# Altium footprint library PBL - THD Packages.PcbLib: 256 footprints (part 4 of 16)
Each footprint in its own frame and in the unit in brackets; x right, y up, seen from the top. Pads: shape width x height; smd on the part's side, far side on the other; paste and mask are expansions set on the pad; w line width, h text height; cw(c..) or ccw(c..) is an arc to the next point about the centre after c.
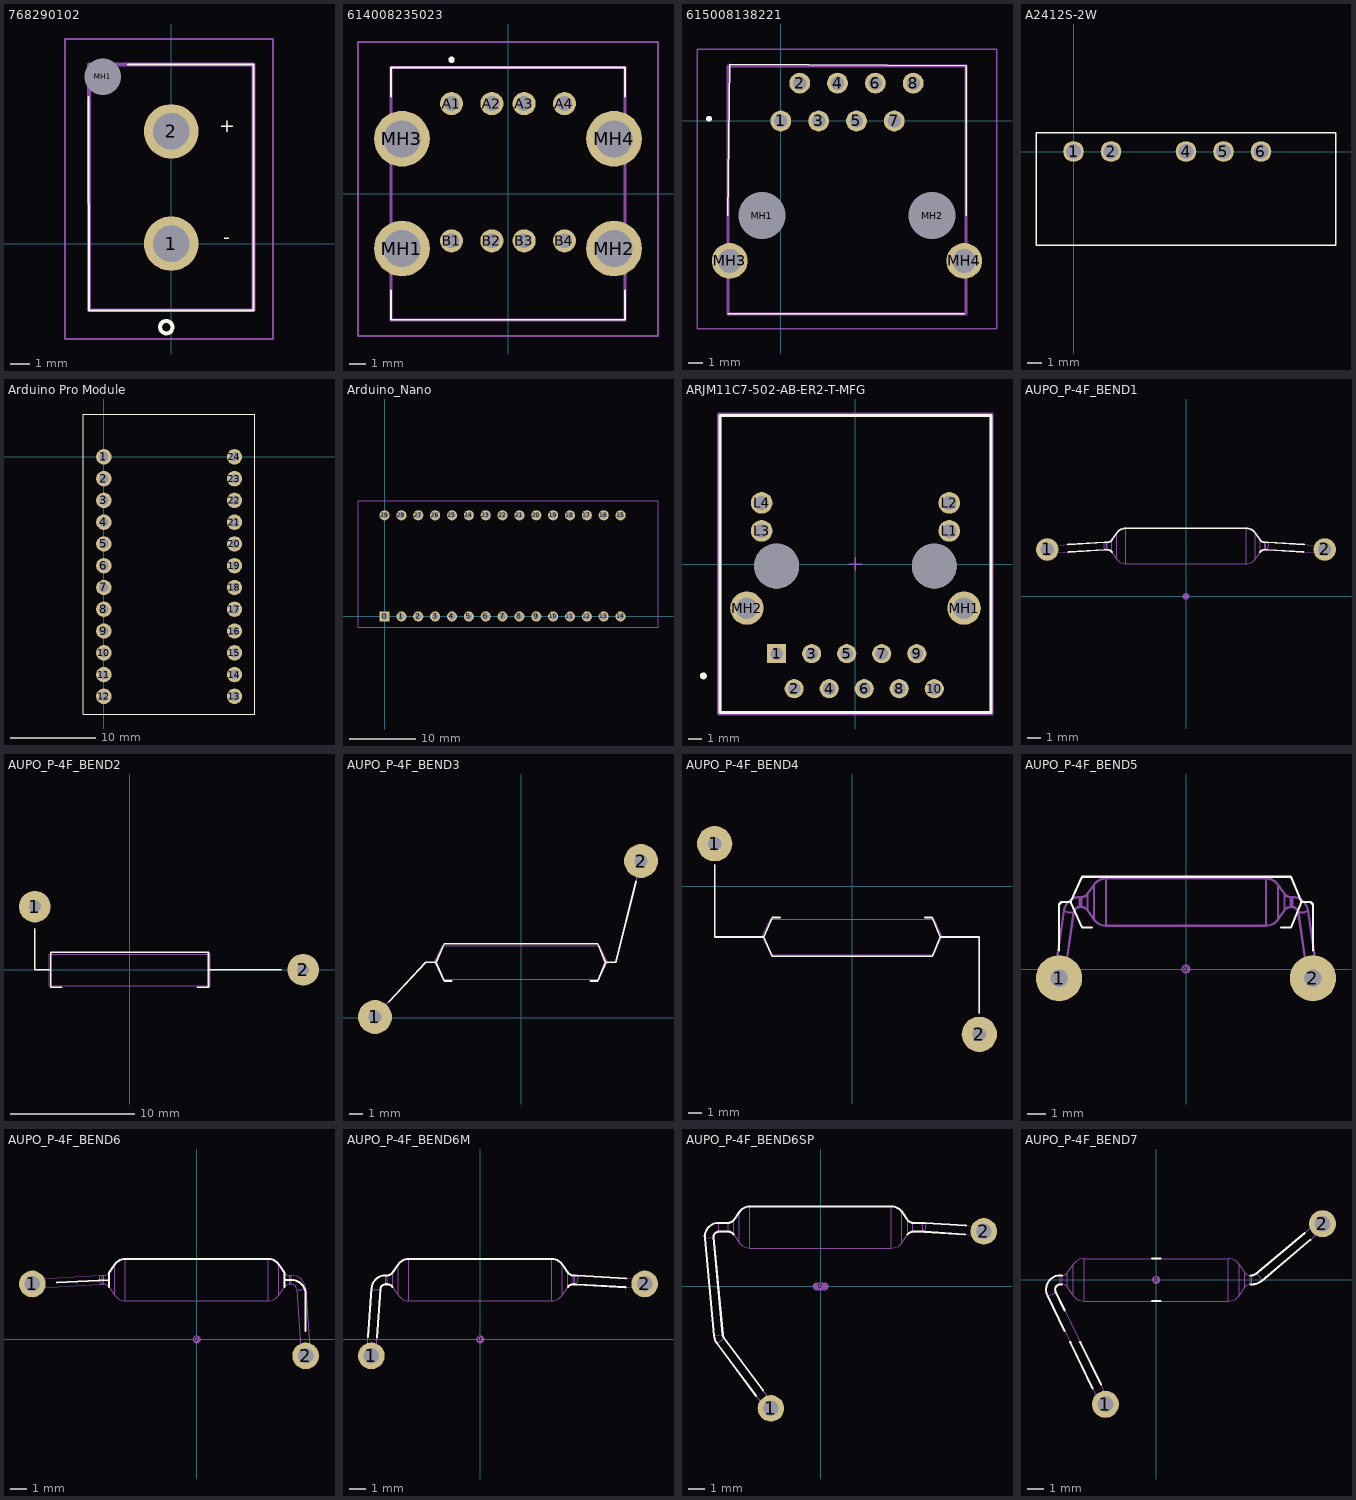
[diagram p3: the footprints below, top view; thin cyan lines are the x and y axes]

## 768290102 [mm] "Molex mega fit"
pads (3):
  round 2.775 hole 1.85: 1(0,0) 2(0,5.7)
  round 0.925 hole 1.85 unplated: MH1(-3.48,8.47)
Top Overlay:
  circle w0.2: c-0.25,-4.25 r0.316
  lines w0.1: -4.2,7.45 -4.175,-3.39 4.175,-3.39 4.175,9.09 -2.2,9.09
  text "+" at 2.45,5.426 h1.2
  text "-" at 2.65,-0.231 h1.2
13 - 3D Top Side:
  lines w0.2: -4.175,-3.39 -4.175,9.09 4.175,9.09 4.175,-3.39 -4.175,-3.39
15 - Top Courtyards:
  lines w0.1: -5.405,-4.85 -5.405,10.395 5.175,10.395 5.175,-4.85 -5.405,-4.85
3D body "76829-0102.stp": height 15.15, standoff -5, extent -4.298,-3.39 4.175,9.293

## 614008235023 [mm]
pads (12):
  round 1.431 hole 0.92: A1(-3.5,5.58) A2(-1,5.58) A3(1,5.58) A4(3.5,5.58) B1(-3.5,-2.92) B2(-1,-2.92) B3(1,-2.92) B4(3.5,-2.92)
  round 3.45 hole 2.3: MH1(-6.57,-3.4) MH2(6.57,-3.4) MH3(-6.57,3.4) MH4(6.57,3.4)
Top Overlay:
  lines w0.1: -7.25,-6 -7.25,-7.82 7.25,-7.82 7.25,-6 ; -7.25,6 -7.25,7.82 7.25,7.82 7.25,6
  lines w0.2: -3.6,8.3 cw(c-3.5,8.3) -3.4,8.3 cw(c-3.5,8.3) -3.6,8.3
13 - 3D Top Side:
  lines w0.2: -7.25,-7.82 7.25,-7.82 7.25,7.82 -7.25,7.82 -7.25,-7.82
15 - Top Courtyards:
  lines w0.1: -9.295,-8.82 9.295,-8.82 9.295,9.4 -9.295,9.4 -9.295,-8.82
3D body "614008235023.stp": height 16.95, standoff -3.55, extent -7.8,-7.925 7.8,7.725

## 615008138221 [mm] "RJ45 Shielded Straight"
pads (12):
  round 1.4 hole 0.9: 1(0,0) 2(1.27,2.54) 3(2.54,0) 4(3.81,2.54) 5(5.08,0) 6(6.35,2.54) 7(7.62,0) 8(8.89,2.54)
  round 1.585 hole 3.17 unplated: MH1(-1.27,-6.35) MH2(10.16,-6.35)
  round 2.4 hole 1.6: MH3(-3.43,-9.4) MH4(12.32,-9.4)
Top Overlay:
  lines w0.1: -3.555,-12.95 12.32,-12.95 ; -3.555,-6.35 -3.43,3.81 12.445,3.7 12.445,-6.35
  lines w0.3: -4.87,0.15 ccw(c-4.82,0.15) -4.77,0.15 ccw(c-4.82,0.15) -4.87,0.15
13 - 3D Top Side:
  lines w0.2: -3.555,-12.95 -3.555,3.7 12.445,3.7 12.445,-12.95 -3.555,-12.95
15 - Top Courtyards:
  lines w0.1: -5.63,-13.95 -5.63,4.81 14.52,4.81 14.52,-13.95 -5.63,-13.95
3D body "70346607.stp": height 17, standoff -2.99, extent -3.297,-12.805 12.197,3.705

## A2412S-2W [mm]
pads (5):
  round 1.4 hole 1: 1(0,0) 2(2.54,0) 4(7.62,0) 5(10.16,0) 6(12.7,0)
Top Overlay:
  lines w0.1: -2.54,-6.35 -2.54,1.27 17.78,1.27 17.78,-6.35 -2.54,-6.35

## Arduino Pro Module [mm]
pads (24):
  round 1.8 hole 1.1: 1(0,0) 2(0,-2.54) 3(0,-5.08) 4(0,-7.62) 5(0,-10.16) 6(0,-12.7) 7(0,-15.24) 8(0,-17.78) 9(0,-20.32) 10(0,-22.86) 11(0,-25.4) 12(0,-27.94) 13(15.24,-27.94) 14(15.24,-25.4) 15(15.24,-22.86) 16(15.24,-20.32) 17(15.24,-17.78) 18(15.24,-15.24) 19(15.24,-12.7) 20(15.24,-10.16) 21(15.24,-7.62) 22(15.24,-5.08) 23(15.24,-2.54) 24(15.24,0)
Top Overlay:
  lines w0.1: -2.4,-30 17.6,-30 17.6,5 -2.4,5 -2.4,-30

## Arduino_Nano [mil]
pads (30):
  rect 60x60 hole 39.37: 0(0,0)
  round 60 hole 39.37: 1(100,0) 2(200,0) 3(300,0) 4(400,0) 5(500,0) 6(600,0) 7(700,0) 8(800,0) 9(900,0) 10(1000,0) 11(1100,0) 12(1200,0) 13(1300,0) 14(1400,0) 15(1400,600) 16(1300,600) 17(1200,600) 18(1100,600) 19(1000,600) 20(900,600) 21(800,600) 22(700,600) 23(600,600) 24(500,600) 25(400,600) 26(300,600) 27(200,600) 28(100,600) 29(0,600)
01 - Outline:
  lines w3.94: -157.48,-62.99 1622.05,-62.99 1622.05,685.04 -157.48,685.04 -157.48,-62.99
3D body "User Library-Arduino Nano 3_0.STEP": height 507.17, standoff -211.89, extent -149.61,-53.94 1615.31,675.98

## ARJM11C7-502-AB-ER2-T-MFG [mm]
pads (18):
  rect 1.39x1.39 hole 0.89 paste-1000 mask+0: 1(-5.715,-6.5)
  round 1.39 hole 0.89 paste-1000 mask+0: 2(-4.445,-9.04) 3(-3.175,-6.5) 4(-1.905,-9.04) 5(-0.635,-6.5) 6(0.635,-9.04) 7(1.905,-6.5) 8(3.175,-9.04) 9(4.445,-6.5) 10(5.715,-9.04)
  round 1.57 hole 1.02 paste-1000 mask+0: L1(6.8,2.4) L2(6.8,4.43) L3(-6.8,2.4) L4(-6.8,4.43)
  round 2.42 hole 1.57 paste-1000 mask+0: MH1(7.875,-3.2) MH2(-7.875,-3.2)
  round 3.25 hole 3.25 unplated paste-1000 mask+0: ""(-5.715,-0.15) ""(5.715,-0.15)
Top Overlay:
  circle w0.25: c-11.025,-8.11 r0.125
  lines w0.2: -9.825,-10.775 -9.825,10.775 9.825,10.775 9.825,-10.775 -9.825,-10.775
Top Courtyard:
  lines w0.2: -9.925,-10.875 -9.925,10.875 9.925,10.875 9.925,-10.875 -9.925,-10.875
Top Assembly:
  lines w0.2: -9.925,-10.875 -9.925,10.875 9.925,10.875 9.925,-10.875 -9.925,-10.875
  text ".Designator" at 0,-0.188 h1
Top 3D Body:
  lines w0.2: -9.825,-10.775 -9.825,10.775 9.825,10.775 9.825,-10.775 -9.825,-10.775
Top Component Center:
  lines w0.1: -0.5,0 0.5,0 ; 0,-0.5 0,0.5
3D body "Conn_Abracon_ARJM11C7-502-AB-ER2-T_eec.STEP": height 15.8, standoff -3.85, extent -9.45,-10.65 9.45,10.65

## AUPO_P-4F_BEND1 [mil] "Aupo P-4F TCO for positioning on IC legs"
height 100
pads (3):
  round 19.68 on Mech15: 0(0,0)
  round 65 / inner round 65 / far side round 90 hole 38: 1(-400,135) 2(400,135)
Top Overlay:
  lines w5: -339.97,149.43 -235.55,155.67 -232.42,155.8 -230.32,155.83 -226.38,155.83 ccw(c-226.38,171.57) -213.48,162.54 -199.33,182.75 cw(c-173.53,164.69) -173.53,196.18 173.53,196.18 cw(c173.53,164.69) 199.33,182.75 213.48,162.54 ccw(c226.38,171.57) 226.38,155.83 230.32,155.83 233.46,155.77 235.55,155.67 340.26,149.42 ; -338.67,127.82 -234.26,134.06 -232.69,134.13 -230.32,134.17 -226.38,134.17 cw(c-226.38,118.43) -213.48,127.46 ; 213.48,127.46 cw(c226.38,118.43) 226.38,134.17 230.32,134.17 231.91,134.15 234.26,134.06 338.97,127.8
13 - 3D Top Side:
  lines w1.97: -381.43,146.96 ccw(c-360.21,137.38) -380.14,125.34 ; 380.14,125.34 ccw(c367.63,134.29) 382.82,136.67 382.89,139.15 382.84,141.46 382.68,143.49 382.42,145.12 382.08,146.27 381.66,146.87 381.43,146.96 ; -235.55,155.67 ccw(c-214.34,146.09) -234.26,134.06 ; -235.55,155.67 -232.42,155.8 -230.32,155.83 ; -235.55,155.67 -400.65,145.81 ccw(c-400,135) -399.35,124.19 -234.26,134.06 ; -234.26,134.06 -232.69,134.13 -230.32,134.17 ; -230.32,134.17 -226.38,134.17 ; -230.32,134.17 -230.32,155.83 ; -230.32,155.83 -226.38,155.83 ; -226.38,134.17 cw(c-226.38,118.43) -213.48,127.46 ; -226.38,134.17 -226.38,155.83 ; -226.38,155.83 ccw(c-226.38,171.57) -213.48,162.54 ; -213.48,127.46 -199.33,107.25 ; -213.48,127.46 -213.48,162.54 ; -213.48,162.54 -199.33,182.75 ; -199.33,107.25 ccw(c-173.53,125.31) -173.53,93.82 ; -199.33,107.25 -199.33,182.75 ; -199.33,182.75 cw(c-173.53,164.69) -173.53,196.18 ; -173.53,93.82 173.53,93.82 ; -173.53,93.82 -173.53,196.18 ; -173.53,196.18 173.53,196.18 ; 173.53,93.82 ccw(c173.53,125.31) 199.33,107.25 ; 173.53,93.82 173.53,196.18 ; 173.53,196.18 cw(c173.53,164.69) 199.33,182.75 ; 199.33,107.25 213.48,127.46 ; 199.33,107.25 199.33,182.75 ; 199.33,182.75 213.48,162.54 ; 213.48,127.46 cw(c226.38,118.43) 226.38,134.17 ; 213.48,127.46 213.48,162.54 ; 213.48,162.54 ccw(c226.38,171.57) 226.38,155.83 ; 226.38,134.17 230.32,134.17 ; 226.38,134.17 226.38,155.83 ; 226.38,155.83 230.32,155.83 ; 230.32,134.17 231.91,134.15 234.26,134.06 ; 230.32,134.17 230.32,155.83 ; 230.32,155.83 233.46,155.77 235.55,155.67 ; 234.26,134.06 ccw(c221.76,143) 236.94,145.39 237.01,147.87 236.96,150.18 236.8,152.21 236.54,153.84 236.19,154.98 235.77,155.59 235.55,155.67 ; 234.26,134.06 399.35,124.19 ccw(c400,135) 400.65,145.81 235.55,155.67
3D body "TH pad - 20 pin x 90.STEP": height 40, standoff 0, extent 355.36,90.1 445,179.92
3D body "AUPO P-F Series TCO Bend1.STEP": height 104.36, standoff -98, extent -410.74,93.93 410.83,196.09
3D body "TH pad - 20 pin x 90.STEP": height 40, standoff 0, extent -444.64,90.1 -355,179.92

## AUPO_P-4F_BEND2 [mil] "Aupo P-4F TCO for positioning on IC legs"
height 100
pads (2):
  round 100 hole 38: 1(-300,200) 2(550,0)
Top Overlay:
  lines w5: -300,130 -300,0 -250,0 ; -215,-55 -250,-55 -250,55 250,55 250,-55 215,-55 ; 250,0 480,0
13 - 3D Top Side:
  lines w3: -255,-50 255,-50 255,49.8 -255,49.8 -255,-50
3D body: height 65, standoff 45, extent -310,-10 -290.1,9.91
3D body: height 65, standoff 45, extent -310,190.02 -290.1,209.94
3D body: height 65, standoff 45, extent 540,-9.98 559.9,9.94
3D body: height 55, standoff -95, extent 540,-9.98 559.92,9.99
3D body: height 104.61, standoff 5, extent -255,-50 255,49.8
3D body: height 65, standoff 45.08, extent 250,-9.96 550,10
3D body: height 65, standoff 45.08, extent -299.5,-9.96 -254.5,10
3D body: height 65, standoff 45.08, extent -309.98,-0.02 -290.02,199.98
3D body: height 55, standoff -95, extent -310,190.02 -290.08,209.98

## AUPO_P-4F_BEND3 [mil] "Aupo P-4F TCO for positioning on IC legs"
height 100
pads (2):
  round 100 hole 38: 1(-431,3) 2(354,463)
Top Overlay:
  lines w5: -389.97,47.04 -281,164 -251,164 ; -205,109 -226.33,109 -251,164 ; 205,109 226.41,109 249,164 ; 338.95,403.01 279,164 249,164 ; -251,164 -226.38,219 226.38,219 249,164
13 - 3D Top Side:
  lines w3: -431,3 -280.63,164.37 -256,164.37 -231.3,213.8 231.3,213.8 254,164.37 278.63,164.37 354,463 ; -256,163.9 -231.3,114 231.3,114 254,163.9
3D body "TCOBend3.stp": height 105.02, standoff -94.88, extent -440.35,-6.96 364.65,473.01

## AUPO_P-4F_BEND4 [mil] "Aupo P-4F TCO for positioning on IC legs"
height 100
pads (2):
  round 100 hole 38: 1(-390,120) 2(360,-420)
Top Overlay:
  lines w5: -390,60 -390,-144 -251,-144 ; -226.38,-199 226.38,-199 249,-144 ; -226.38,-89 -251,-144 ; -226.33,-199 -251,-144 ; -226.33,-89 -205,-89 ; 205,-89 226.41,-89 249,-144 ; 360,-360 360,-144 249,-144
13 - 3D Top Side:
  lines w3: -390,60 -390,-144 -256,-144 ; -256,-144.1 -231.3,-194 231.3,-194 254,-144.1 ; -256,-143.63 -231.3,-94.2 231.3,-94.2 254,-143.63 ; 254,-144 360,-144 360,-360
3D body "TCOBend4.stp": height 105.02, standoff -94.88, extent -399.95,-430.6 369.97,129.36

## AUPO_P-4F_BEND5 [mil] "Aupo P-4F TCO for positioning on IC legs"
height 100
pads (3):
  round 19.68 on Mech15: 0(0,0)
  round 100 hole 38: 1(-275,-20) 2(275,-20)
Top Overlay:
  lines w5: -275,40 -275,140 -270,145 -250,145 ; -204,90 -225.33,90 -250,145 ; 206,90 227.41,90 250,145 ; 275,40 275,140 270,145 250,145 ; -250,145 -225.38,200 227.38,200 250,145
13 - 3D Top Side:
  lines w5: -282.92,0.59 ccw(c-269.19,19.56) -261.5,-2.55 ; 261.5,-2.55 ccw(c268.97,22.97) 282.85,0.28 282.92,0.59 ; -264.41,126.68 cw(c-230.49,121.52) -230.32,155.83 ; -264.41,126.68 ccw(c-250.67,145.69) -242.98,123.53 ; -264.41,126.68 -285.71,-18.43 ccw(c-275,-20) -264.29,-21.57 -242.98,123.54 ; -242.98,123.54 cw(c-230.48,121.51) -230.32,134.17 ; -230.32,134.17 -226.38,134.17 ; -230.32,134.17 -230.32,155.83 ; -230.32,155.83 -226.38,155.83 ; -226.38,134.17 cw(c-226.38,118.43) -213.48,127.46 ; -226.38,134.17 -226.38,155.83 ; -226.38,155.83 ccw(c-226.38,171.57) -213.48,162.54 ; -213.48,127.46 -199.33,107.25 ; -213.48,127.46 -213.48,162.54 ; -213.48,162.54 -199.33,182.75 ; -199.33,107.25 ccw(c-173.53,125.31) -173.53,93.82 ; -199.33,107.25 -199.33,182.75 ; -199.33,182.75 cw(c-173.53,164.69) -173.53,196.18 ; -173.53,93.82 173.53,93.82 ; -173.53,93.82 -173.53,196.18 ; -173.53,196.18 173.53,196.18 ; 173.53,93.82 ccw(c173.53,125.31) 199.33,107.25 ; 173.53,93.82 173.53,196.18 ; 173.53,196.18 cw(c173.53,164.69) 199.33,182.75 ; 199.33,107.25 213.48,127.46 ; 199.33,107.25 199.33,182.75 ; 199.33,182.75 213.48,162.54 ; 213.48,127.46 cw(c226.38,118.43) 226.38,134.17 ; 213.48,127.46 213.48,162.54 ; 213.48,162.54 ccw(c226.38,171.57) 226.38,155.83 ; 226.38,134.17 230.32,134.17 ; 226.38,134.17 226.38,155.83 ; 226.38,155.83 230.32,155.83 ; 230.32,134.17 cw(c230.48,121.51) 242.98,123.54 ; 230.32,134.17 230.32,155.83 ; 230.32,155.83 cw(c230.49,121.51) 264.41,126.68 ; 242.98,123.54 ccw(c250.45,149.1) 264.34,126.38 264.41,126.68 ; 242.98,123.54 264.29,-21.57 ccw(c275,-20) 285.83,-20 285.71,-18.43 264.41,126.68
3D body "AUPO P-F Series TCO Bend5.STEP": height 102.36, standoff -100, extent -285.73,-30.8 285.83,196.09

## AUPO_P-4F_BEND6 [mil] "Aupo P-4F TCO for positioning on IC legs"
height 100
pads (3):
  round 19.68 on Mech15: 0(0,0)
  round 65 / inner round 65 / far side round 90 hole 38: 1(-400,135) 2(265,-40)
Top Overlay:
  lines w5: -340.17,138.21 -213.48,145 ; -213.48,127.46 -213.48,162.54 -199.33,182.75 cw(c-173.53,164.69) -173.53,196.18 173.53,196.18 cw(c173.53,164.69) 199.33,182.75 213.48,162.54 213.48,127.46 ; 213.48,145 230,145 cw(c230,110) 265,110 265,20
13 - 3D Top Side:
  lines w1.97: -381.43,146.96 ccw(c-359.97,137.39) -380.14,125.34 ; 252.86,-21.08 ccw(c262.11,4.31) 274.45,-19.73 274.46,-19.61 ; -235.55,155.67 ccw(c-214.1,146.11) -234.26,134.06 ; -235.55,155.67 -232.3,155.8 -230.32,155.83 ; -235.55,155.67 -400.65,145.81 ccw(c-400,135) -399.35,124.19 -234.26,134.06 ; -234.26,134.06 -232.78,134.13 -230.32,134.17 ; -230.32,134.17 -226.38,134.17 ; -230.32,134.17 -230.32,155.83 ; -230.32,155.83 -226.38,155.83 ; -226.38,134.17 cw(c-226.38,118.43) -213.48,127.46 ; -226.38,134.17 -226.38,155.83 ; -226.38,155.83 ccw(c-226.38,171.57) -213.48,162.54 ; -213.48,127.46 -213.48,162.54 ; -213.48,127.46 -199.33,107.25 ; -213.48,162.54 -199.33,182.75 ; -199.33,107.25 ccw(c-173.53,125.31) -173.53,93.82 ; -199.33,107.25 -199.33,182.75 ; -199.33,182.75 cw(c-173.53,164.69) -173.53,196.18 ; -173.53,93.82 173.53,93.82 ; -173.53,93.82 -173.53,196.18 ; -173.53,196.18 173.53,196.18 ; 173.53,93.82 ccw(c173.53,125.31) 199.33,107.25 ; 173.53,93.82 173.53,196.18 ; 173.53,196.18 cw(c173.53,164.69) 199.33,182.75 ; 199.33,107.25 213.48,127.46 ; 199.33,107.25 199.33,182.75 ; 199.33,182.75 213.48,162.54 ; 213.48,127.46 cw(c226.38,118.43) 226.38,134.17 ; 213.48,127.46 213.48,162.54 ; 213.48,162.54 ccw(c226.38,171.57) 226.38,155.83 ; 226.38,134.17 230.32,134.17 ; 226.38,134.17 226.38,155.83 ; 226.38,155.83 230.32,155.83 ; 230.32,134.17 cw(c230.47,121.52) 243.08,122.53 ; 230.32,134.17 230.32,155.83 ; 230.32,155.83 cw(c230.46,121.51) 264.69,124 ; 243.08,122.53 ccw(c252.33,147.93) 264.67,123.88 264.69,124 ; 243.08,122.53 254.2,-40.74 ccw(c265,-40) 275.83,-40 275.8,-39.26 264.69,124
3D body "TH pad - 20 pin x 90.STEP": height 40, standoff 0, extent 219.99,-84.91 309.64,4.91
3D body "AUPO P-F Series TCO Bend6.STEP": height 102.87, standoff -99.49, extent -410.74,-50.8 275.83,196.09
3D body "TH pad - 20 pin x 90.STEP": height 40, standoff 0, extent -445,90.09 -355.36,179.91

## AUPO_P-4F_BEND6M [mil] "Aupo P-4F TCO for positioning on IC legs"
height 100
pads (3):
  round 19.68 on Mech15: 0(0,0)
  round 65 / inner round 65 / far side round 90 hole 38: 1(-265,-40) 2(400,135)
Top Overlay:
  lines w5: -272.66,6.54 -264.69,124.01 cw(c-230.48,121.53) -230.32,155.83 -226.38,155.83 ccw(c-226.38,171.57) -213.48,162.54 -199.33,182.75 cw(c-173.53,164.69) -173.53,196.18 173.53,196.18 cw(c173.53,164.69) 199.33,182.75 213.48,162.54 ccw(c226.38,171.57) 226.38,155.83 230.32,155.83 233.67,155.76 235.64,155.67 354.91,148.54 ; -251.05,5.07 -243.08,122.54 cw(c-230.46,121.51) -230.32,134.17 -226.38,134.17 cw(c-226.38,118.43) -213.48,127.46 ; 213.48,127.46 cw(c226.38,118.43) 226.38,134.17 230.32,134.17 231.82,134.16 234.34,134.05 353.62,126.93
13 - 3D Top Side:
  lines w1.97: -274.43,-19.69 ccw(c-262.06,2.73) -252.83,-21.16 ; 380.23,125.34 ccw(c367.39,134.41) 382.95,136.67 383.02,139.06 382.98,141.3 382.83,143.28 382.58,144.91 382.25,146.1 381.85,146.78 381.52,146.95 ; -264.69,124.01 cw(c-230.48,121.53) -230.32,155.83 ; -264.69,124.01 ccw(c-252.3,146.47) -243.08,122.54 ; -264.69,124.01 -275.76,-39.27 ccw(c-264.96,-40) -254.16,-40.73 -243.08,122.54 ; -243.08,122.54 cw(c-230.46,121.51) -230.32,134.17 ; -230.32,134.17 -226.38,134.17 ; -230.32,134.17 -230.32,155.83 ; -230.32,155.83 -226.38,155.83 ; -226.38,134.17 cw(c-226.38,118.43) -213.48,127.46 ; -226.38,134.17 -226.38,155.83 ; -226.38,155.83 ccw(c-226.38,171.57) -213.48,162.54 ; -213.48,127.46 -199.33,107.25 ; -213.48,127.46 -213.48,162.54 ; -213.48,162.54 -199.33,182.75 ; -199.33,107.25 ccw(c-173.53,125.31) -173.53,93.82 ; -199.33,107.25 -199.33,182.75 ; -199.33,182.75 cw(c-173.53,164.69) -173.53,196.18 ; -173.53,93.82 173.53,93.82 ; -173.53,93.82 -173.53,196.18 ; -173.53,196.18 173.53,196.18 ; 173.53,93.82 ccw(c173.53,125.31) 199.33,107.25 ; 173.53,93.82 173.53,196.18 ; 173.53,196.18 cw(c173.53,164.69) 199.33,182.75 ; 199.33,107.25 213.48,127.46 ; 199.33,107.25 199.33,182.75 ; 199.33,182.75 213.48,162.54 ; 213.48,127.46 cw(c226.38,118.43) 226.38,134.17 ; 213.48,127.46 213.48,162.54 ; 213.48,162.54 ccw(c226.38,171.57) 226.38,155.83 ; 226.38,134.17 230.32,134.17 ; 226.38,134.17 226.38,155.83 ; 226.38,155.83 230.32,155.83 ; 230.32,134.17 231.82,134.16 234.34,134.05 ; 230.32,134.17 230.32,155.83 ; 230.32,155.83 233.67,155.76 235.64,155.67 ; 234.34,134.05 ccw(c221.51,143.13) 237.07,145.38 237.13,147.77 237.09,150.02 236.94,152 236.69,153.63 236.36,154.82 235.96,155.5 235.64,155.67 ; 234.34,134.05 399.35,124.19 ccw(c400,135) 400.65,145.81 235.64,155.67
3D body "TH pad - 20 pin x 90.STEP": height 40, standoff 0, extent 355.36,90.1 445,179.92
3D body "AUPO P-F Series TCO Bend6M.STEP": height 102.95, standoff -100, extent -275.7,-50.8 410.83,196.09
3D body "TH pad - 20 pin x 90.STEP": height 40, standoff 0, extent -309.64,-84.91 -220,4.92

## AUPO_P-4F_BEND6SP [mil] "Aupo P-4F TCO for positioning on IC legs"
height 100
pads (3):
  oval 39.37x19.68 on Mech15: 0(0,0)
  round 65 / inner round 65 / far side round 90 hole 38: 1(-122.05,-299.21) 2(400,135)
Top Overlay:
  lines w5: -213.48,127.46 ccw(c-226.38,118.43) -226.38,134.17 -250,134.17 ccw(c-250,121.38) -262.74,120.18 -240.21,-119.23 ccw(c-226.81,-118) -237.62,-126.01 -141.14,-255.47 ; -158.51,-268.41 -254.99,-138.95 cw(c-226.81,-118) -261.77,-121.26 -284.3,118.15 cw(c-250,121.38) -250,155.83 -226.38,155.83 ccw(c-226.38,171.57) -213.48,162.54 -199.33,182.75 cw(c-173.53,164.69) -173.53,196.18 173.53,196.18 cw(c173.53,164.69) 199.33,182.75 213.48,162.54 ccw(c226.38,171.57) 226.38,155.83 250,155.83 253.99,155.74 256.09,155.62 355.88,148.85 ; 213.48,127.46 cw(c226.38,118.43) 226.38,134.17 250,134.17 251.63,134.15 254.63,134.02 354.42,127.24
13 - 3D Top Side:
  lines w1.97: -142.8,-289.48 ccw(c-154.49,-254.64) -126.6,-278.57 -125.76,-277.53 -125.4,-276.81 -125.44,-276.54 ; 380.81,125.45 ccw(c367.01,135.36) 383.94,136.83 384,139.39 383.93,141.77 383.72,143.84 383.38,145.46 382.93,146.54 382.4,147.03 382.28,147.05 ; -284.3,118.15 cw(c-250,121.38) -250,155.83 ; -284.3,118.15 -262.74,120.18 ; -284.3,118.15 -261.77,-121.26 ; -262.74,120.18 cw(c-250,121.38) -250,134.17 ; -262.74,120.18 -240.21,-119.23 ; -261.77,-121.26 ccw(c-226.81,-118) -254.99,-138.95 ; -261.77,-121.26 -240.21,-119.23 ; -254.99,-138.95 ccw(c-266.66,-104.11) -238.78,-128.04 -237.94,-127 -237.58,-126.28 -237.62,-126.01 ; -254.99,-138.95 -130.73,-305.68 ccw(c-122.05,-299.21) -113.37,-292.74 -237.62,-126.01 ; -250,134.17 -250,155.83 ; -250,134.17 -226.38,134.17 ; -250,155.83 -226.38,155.83 ; -240.21,-119.23 ccw(c-226.81,-118) -237.62,-126.01 ; -226.38,134.17 cw(c-226.38,118.43) -213.48,127.46 ; -226.38,134.17 -226.38,155.83 ; -226.38,155.83 ccw(c-226.38,171.57) -213.48,162.54 ; -213.48,127.46 -213.48,162.54 ; -213.48,127.46 -199.33,107.25 ; -213.48,162.54 -199.33,182.75 ; -199.33,107.25 ccw(c-173.53,125.31) -173.53,93.82 ; -199.33,107.25 -199.33,182.75 ; -199.33,182.75 cw(c-173.53,164.69) -173.53,196.18 ; -173.53,93.82 -173.53,196.18 ; -173.53,93.82 173.53,93.82 ; -173.53,196.18 173.53,196.18 ; 173.53,93.82 ccw(c173.53,125.31) 199.33,107.25 ; 173.53,93.82 173.53,196.18 ; 173.53,196.18 cw(c173.53,164.69) 199.33,182.75 ; 199.33,107.25 199.33,182.75 ; 199.33,107.25 213.48,127.46 ; 199.33,182.75 213.48,162.54 ; 213.48,127.46 cw(c226.38,118.43) 226.38,134.17 ; 213.48,127.46 213.48,162.54 ; 213.48,162.54 ccw(c226.38,171.57) 226.38,155.83 ; 226.38,134.17 226.38,155.83 ; 226.38,134.17 250,134.17 ; 226.38,155.83 250,155.83 ; 250,134.17 250,155.83 ; 250,134.17 251.63,134.15 254.63,134.02 ; 250,155.83 253.99,155.74 256.09,155.62 ; 254.63,134.02 ccw(c240.84,143.92) 257.75,145.39 257.82,147.96 257.74,150.34 257.53,152.4 257.19,154.02 256.74,155.11 256.22,155.6 256.09,155.62 ; 254.63,134.02 399.27,124.2 ccw(c400,135) 400.73,145.8 256.09,155.62
3D body "TH pad - 20 pin x 90.STEP": height 40, standoff 0, extent 355.36,90.1 445,179.92
3D body "AUPO P-4F BEND6SP.STEP": height 102.95, standoff -100, extent -284.29,-310.01 410.83,196.09
3D body "TH pad - 20 pin x 90.STEP": height 40, standoff 0, extent -166.69,-344.12 -77.04,-254.29

## AUPO_P-4F_BEND7 [mil] "Aupo P-4F TCO for positioning on IC legs"
height 100
pads (3):
  round 19.68 on Mech15: 0(0,0)
  round 65 / inner round 65 / far side round 90 hole 38: 1(-122.05,-299.21) 2(400,135)
Top Overlay:
  lines w5: -226.38,-10.83 -230.32,-10.83 ccw(c-230.71,-23.12) -241.92,-28.19 -220,-73.23 ; -226.38,10.83 -230.32,10.83 ccw(c-230.77,-23.09) -261.39,-37.67 -220,-122.7 ; -206.71,-150 -152.67,-261.03 ; -182.63,-150 -133.2,-251.56 ; -10,-51.18 10,-51.18 ; -10,51.18 10,51.18 ; 226.38,-10.83 230.32,-10.83 ccw(c230.57,25.09) 253.54,-2.52 370.8,96.25 ; 226.38,10.83 230.32,10.83 ccw(c230.51,25.26) 239.59,14.04 356.85,112.81
13 - 3D Top Side:
  lines w1.97: -140.07,-286.92 ccw(c-140.58,-259.77) -121.17,-278.77 -120.63,-277.98 -120.6,-277.44 ; 380.65,132.86 381.22,133.11 382.26,133.05 383.6,132.53 385.15,131.57 386.84,130.24 388.57,128.61 390.25,126.76 391.78,124.79 393.1,122.81 394.11,120.92 394.78,119.23 395.06,117.83 394.95,116.8 394.6,116.3 ; -261.39,-37.67 cw(c-230.77,-23.09) -230.32,10.83 ; -261.39,-37.67 ccw(c-261.89,-10.52) -242.49,-29.52 -241.95,-28.73 -241.91,-28.2 ; -261.39,-37.67 -131.78,-303.95 ccw(c-122.05,-299.21) -111.22,-299.21 -111.51,-296.72 -112.31,-294.47 -241.92,-28.19 ; -241.92,-28.19 cw(c-230.71,-23.12) -230.32,-10.83 ; -230.32,-10.83 -226.38,-10.83 ; -230.32,-10.83 -230.32,10.83 ; -230.32,10.83 -226.38,10.83 ; -226.38,-10.83 cw(c-226.38,-26.57) -213.48,-17.54 ; -226.38,-10.83 -226.38,10.83 ; -226.38,10.83 ccw(c-226.38,26.57) -213.48,17.54 ; -213.48,-17.54 -199.33,-37.75 ; -213.48,-17.54 -213.48,17.54 ; -213.48,17.54 -199.33,37.75 ; -199.33,-37.75 ccw(c-173.53,-19.69) -173.53,-51.18 ; -199.33,-37.75 -199.33,37.75 ; -199.33,37.75 cw(c-173.53,19.69) -173.53,51.18 ; -173.53,-51.18 173.53,-51.18 ; -173.53,-51.18 -173.53,51.18 ; -173.53,51.18 173.53,51.18 ; 173.53,-51.18 ccw(c173.53,-19.68) 199.33,-37.75 ; 173.53,-51.18 173.53,51.18 ; 173.53,51.18 cw(c173.53,19.69) 199.33,37.75 ; 199.33,-37.75 213.48,-17.54 ; 199.33,-37.75 199.33,37.75 ; 199.33,37.75 213.48,17.54 ; 213.48,-17.54 cw(c226.38,-26.57) 226.38,-10.83 ; 213.48,-17.54 213.48,17.54 ; 213.48,17.54 ccw(c226.38,26.57) 226.38,10.83 ; 226.38,-10.83 230.32,-10.83 ; 226.38,-10.83 226.38,10.83 ; 226.38,10.83 230.32,10.83 ; 230.32,-10.83 ccw(c230.57,25.09) 253.54,-2.52 ; 230.32,-10.83 230.32,10.83 ; 230.32,10.83 ccw(c230.51,25.26) 239.59,14.04 ; 239.59,14.04 240.15,14.29 241.2,14.23 242.54,13.7 244.09,12.75 245.78,11.42 247.51,9.79 249.19,7.94 250.72,5.97 252.03,3.99 253.05,2.1 253.72,0.41 254,-0.99 253.88,-2.02 253.54,-2.52 ; 239.59,14.04 393.03,143.28 cw(c400,135) 406.98,126.72 253.54,-2.52
3D body "TH pad - 20 pin x 90.STEP": height 40, standoff 0, extent -166.69,-344.12 -77.04,-254.29
3D body "AUPO P-F Series TCO BEND7.STEP": height 137.8, standoff -100, extent -264.69,-310.01 410.83,145.81
3D body "TH pad - 20 pin x 90.STEP": height 40, standoff 0, extent 355.36,90.1 445,179.92